# Altium footprint library SMDLibrary.PcbLib: 306 footprints (part 3 of 20)
Each footprint in its own frame and in the unit in brackets; x right, y up, seen from the top. Pads: shape width x height; smd on the part's side, far side on the other; paste and mask are expansions set on the pad; w line width, h text height; cw(c..) or ccw(c..) is an arc to the next point about the centre after c.
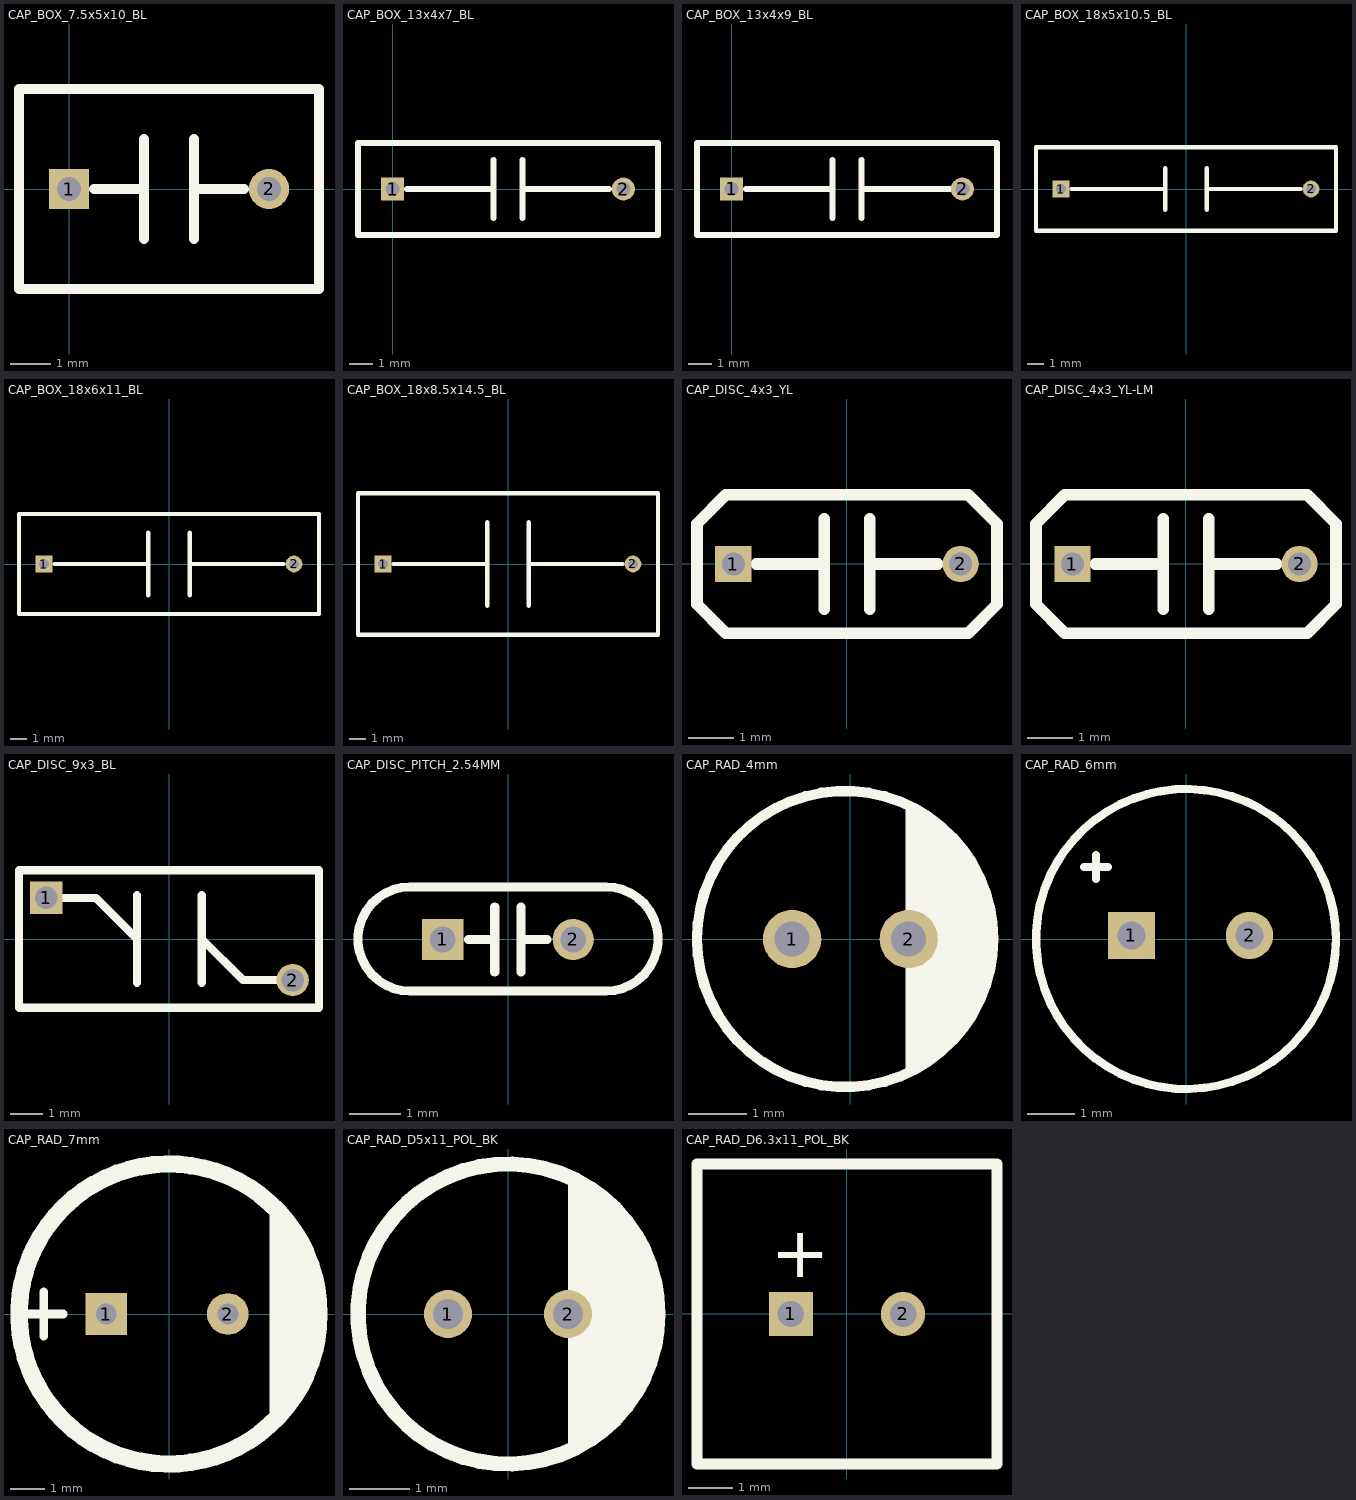
[diagram p2: the footprints below, top view; thin cyan lines are the x and y axes]

## CAP_BOX_7.5x5x10_BL [mm]
pads (2):
  rect 1x1 hole 0.6: 1(0,0)
  round 1 hole 0.6: 2(5,0)
Top Overlay:
  lines w0.254: 0.625,0 1.875,0 ; 1.875,-1.25 1.875,1.25 ; 3.125,-1.25 3.125,1.25 ; 3.125,0 4.375,0 ; -1.25,-2.5 6.25,-2.5 6.25,2.5 -1.25,2.5 -1.25,-2.5
3D body "CAP_BOX_7.5x5x10_BL.stp": height 10, standoff -2.5, extent -1.25,-2.5 6.25,2.5

## CAP_BOX_13x4x7_BL [mm]
pads (2):
  rect 1x1 hole 0.6: 1(0,0)
  round 1 hole 0.6: 2(10,0)
Top Overlay:
  lines w0.254: 0.625,0 4.375,0 ; 4.375,-1.25 4.375,1.25 ; 5.625,-1.25 5.625,1.25 ; 5.625,0 9.375,0 ; -1.5,-2 11.5,-2 11.5,2 -1.5,2 -1.5,-2
3D body "CAP_BOX_13x4x7_BL.stp": height 7, standoff -2.5, extent -1.5,-2 11.5,2

## CAP_BOX_13x4x9_BL [mm]
pads (2):
  rect 1x1 hole 0.6: 1(0,0)
  round 1 hole 0.6: 2(10,0)
Top Overlay:
  lines w0.254: 0.625,0 4.375,0 ; 4.375,-1.25 4.375,1.25 ; 5.625,-1.25 5.625,1.25 ; 5.625,0 10,0 ; -1.5,-2 -1.5,2 11.5,2 11.5,-2 -1.5,-2
3D body "CAP_BOX_13x4x9_BL.stp": height 9, standoff -2.5, extent -1.5,-2 11.5,2

## CAP_BOX_18x5x10.5_BL [mm]
pads (2):
  rect 1x1 hole 0.6: 1(-7.5,0)
  round 1 hole 0.6: 2(7.5,0)
Top Overlay:
  lines w0.254: -6.875,0 -1.25,0 ; -1.25,-1.25 -1.25,1.25 ; 1.25,-1.25 1.25,1.25 ; 1.25,0 6.875,0 ; -9,-2.5 -9,2.5 9,2.5 9,-2.5 -9,-2.5
3D body "CAP_BOX_18x5x10.5_BL.stp": height 10.5, standoff -2.5, extent -9,-2.5 9,2.5

## CAP_BOX_18x6x11_BL [mm]
pads (2):
  rect 1x1 hole 0.6: 1(-7.5,0)
  round 1 hole 0.6: 2(7.5,0)
Top Overlay:
  lines w0.254: -6.875,0 -1.25,0 ; -1.25,-1.875 -1.25,1.875 ; 1.25,-1.875 1.25,1.875 ; 1.25,0 6.875,0 ; -9,-3 -9,3 9,3 9,-3 -9,-3
3D body "CAP_BOX_18x6x11_BL.stp": height 11, standoff -2.5, extent -9,-3 9,3

## CAP_BOX_18x8.5x14.5_BL [mm]
pads (2):
  rect 1x1 hole 0.6: 1(-7.5,0)
  round 1 hole 0.6: 2(7.5,0)
Top Overlay:
  lines w0.254: -6.875,0 -1.25,0 -1.25,-2.5 ; -1.25,-1.875 -1.25,2.5 ; 1.25,-2.5 1.25,2.5 ; 1.25,0 6.875,0 ; -9,-4.25 -9,4.25 9,4.25 9,-4.25 -9,-4.25
3D body "CAP_BOX_18x8.5x14.5_BL.stp": height 14.5, standoff -2.5, extent -9,-4.25 9,4.25

## CAP_DISC_4x3_YL [mm]
pads (2):
  rect 0.8x0.8 hole 0.5: 1(-2.5,0)
  round 0.8 hole 0.5: 2(2.5,0)
Top Overlay:
  lines w0.254: -2,0 -0.5,0 ; -0.5,-1 -0.5,1 ; 0.5,-1 0.5,1 ; 0.5,0 2,0 ; -3.302,-0.889 -3.302,0.889 -2.667,1.524 2.667,1.524 3.302,0.889 3.302,-0.889 2.667,-1.524 -2.667,-1.524 -3.302,-0.889
3D body "CAP_DISC_4x3_YL.stp": height 5.47, standoff -2, extent -2.725,-1.5 2.724,1.5

## CAP_DISC_4x3_YL-LM [mm]
pads (2):
  rect 0.8x0.8 hole 0.5: 1(-2.5,0)
  round 0.8 hole 0.5: 2(2.5,0)
Top Overlay:
  lines w0.254: -2,0 -0.5,0 ; -0.5,-1 -0.5,1 ; 0.5,-1 0.5,1 ; 0.5,0 2,0 ; -3.302,-0.889 -2.667,-1.524 2.667,-1.524 3.302,-0.889 3.302,0.889 2.667,1.524 -2.667,1.524 -3.302,0.889 -3.302,-0.889
3D body "CAP_DISC_4x3_YL-LM.stp": height 5.49, standoff -2.5, extent -2.788,-1.5 2.788,1.5

## CAP_DISC_9x3_BL [mm]
pads (2):
  rect 1x1 hole 0.7: 1(-3.81,1.27)
  round 1 hole 0.7: 2(3.81,-1.27)
Top Overlay:
  lines w0.254: -3.81,1.27 -2.27,1.27 -1,0 ; -1,-1.35 -1,1.35 ; 1,-1.35 1,1.35 ; 1,0 2.27,-1.27 3.81,-1.27 ; -4.65,-2.125 4.625,-2.125 4.625,2.125 -4.65,2.125 -4.65,-2.125
3D body "CAP_DISC_9x3_BL.stp": height 11.6, standoff -2.9, extent -4.653,-2.118 4.653,2.118

## CAP_DISC_PITCH_2.54MM [mm]
pads (2):
  rect 0.8x0.8 hole 0.5: 1(-1.27,0)
  round 0.8 hole 0.5: 2(1.27,0)
Top Overlay:
  lines w0.178: -0.766,0 -0.258,0 ; -0.258,-0.635 -0.258,0.635 ; 0.25,-0.635 0.25,0.635 ; 0.25,0 0.758,0 ; -1.905,-1.007 cw(c-1.905,0.009) -1.905,1.025 1.905,1.025 cw(c1.905,0.009) 1.905,-1.007 -1.905,-1.007
3D body "cn104.STEP": height 5.97, standoff -1.95, extent -2.921,-0.848 2.921,0.848

## CAP_RAD_4mm [mm]
pads (2):
  round 1 hole 0.6: 1(-1,0) 2(1,0)
Top Overlay:
  circle w0.178: c-0.092,0 r2.54
  region: 0.95,2.3 0.95,-2.325 1.4,-2.075 1.775,-1.725 2.1,-1.325 2.3,-0.9 2.4,-0.7 2.515,0.034 2.475,0.275 2.4,0.575 2.225,1.1 2.025,1.425 1.775,1.725 1.5,2 1.175,2.225
3D body "User Library-Cap electro 5x7x2mm.STEP": height 7.29, standoff -3.51, extent -2.53,-2.525 2.52,2.525

## CAP_RAD_5mm [mm]
3D body "cpol-v_p5_d12-5_h20.stp": height 6.25, standoff -6.25, extent -8.574,-2.65 3.925,20.16

## CAP_RAD_6mm [mm]
pads (2):
  rect 1x1 hole 0.6: 1(-1.155,0.075)
  round 1 hole 0.6: 2(1.345,0.075)
Top Overlay:
  circle w0.178: c0,0 r3.175
  lines w0.178: -2.159,1.524 -1.651,1.524 ; -1.905,1.27 -1.905,1.778
3D body "User Library-Cap 6_3x11.STEP": height 11.02, standoff -18.98, extent -3.073,-3.074 3.227,3.226

## CAP_RAD_7mm [mm]
pads (2):
  rect 1.2x1.2 hole 0.6: 1(-1.805,0)
  round 1.2 hole 0.6: 2(1.695,0)
Top Overlay:
  circle w0.5: c0,0 r4.318
  lines w0.254: -4.191,0 -3.048,0 ; -3.607,-0.635 -3.607,0.635 ; 3.02,-3.025 3.02,3 ; 3.27,-2.75 3.27,2.75 ; 3.52,-2.425 3.52,2.475 ; 3.72,-1.925 3.72,1.8 ; 3.92,-1.4 3.92,1.4 ; 4.095,-0.575 4.095,0.4
3D body "User Library-CAP 8X11_5.STEP": height 11.33, standoff -19.16, extent -4.063,-4 3.937,4

## CAP_RAD_D5x11_POL_BK [mm]
pads (2):
  round 0.8 hole 0.5: 1(-1,0) 2(1,0)
Top Overlay:
  circle w0.254: c0,0 r2.5
  region: 1,2.25 1,-2.25 1.154,-2.165 1.44,-1.96 1.699,-1.722 1.928,-1.455 2.123,-1.162 2.282,-0.848 2.402,-0.518 2.481,-0.175 2.5,0 2.481,0.175 2.402,0.518 2.282,0.848 2.123,1.162 1.928,1.455 1.699,1.722 1.44,1.96 1.154,2.165
  region: 1.3,2.25
3D body "CAP_RAD_D5x11_POL_BK.stp": height 12.7, standoff -2.3, extent -2.75,-2.75 2.75,2.75

## CAP_RAD_D6.3x11_POL_BK [mm]
pads (2):
  rect 1x1 hole 0.6: 1(-1.27,0)
  round 1 hole 0.6: 2(1.27,0)
Top Overlay:
  region: 1.3,2.25
  lines w0.254: -3.4,-3.4 -3.4,3.4 3.4,3.4 3.4,-3.4 -3.4,-3.4
  text "+" at -1.725,0.45 h2
3D body "CAP_RAD_D6.3x11_POL_BK.stp": height 12.5, standoff -2.5, extent -3.4,-3.399 3.4,3.4